# Altium footprint library MARCS Footprints.PcbLib: 53 footprints (part 2 of 4)
Each footprint in its own frame and in the unit in brackets; x right, y up, seen from the top. Pads: shape width x height; smd on the part's side, far side on the other; paste and mask are expansions set on the pad; w line width, h text height; cw(c..) or ccw(c..) is an arc to the next point about the centre after c.
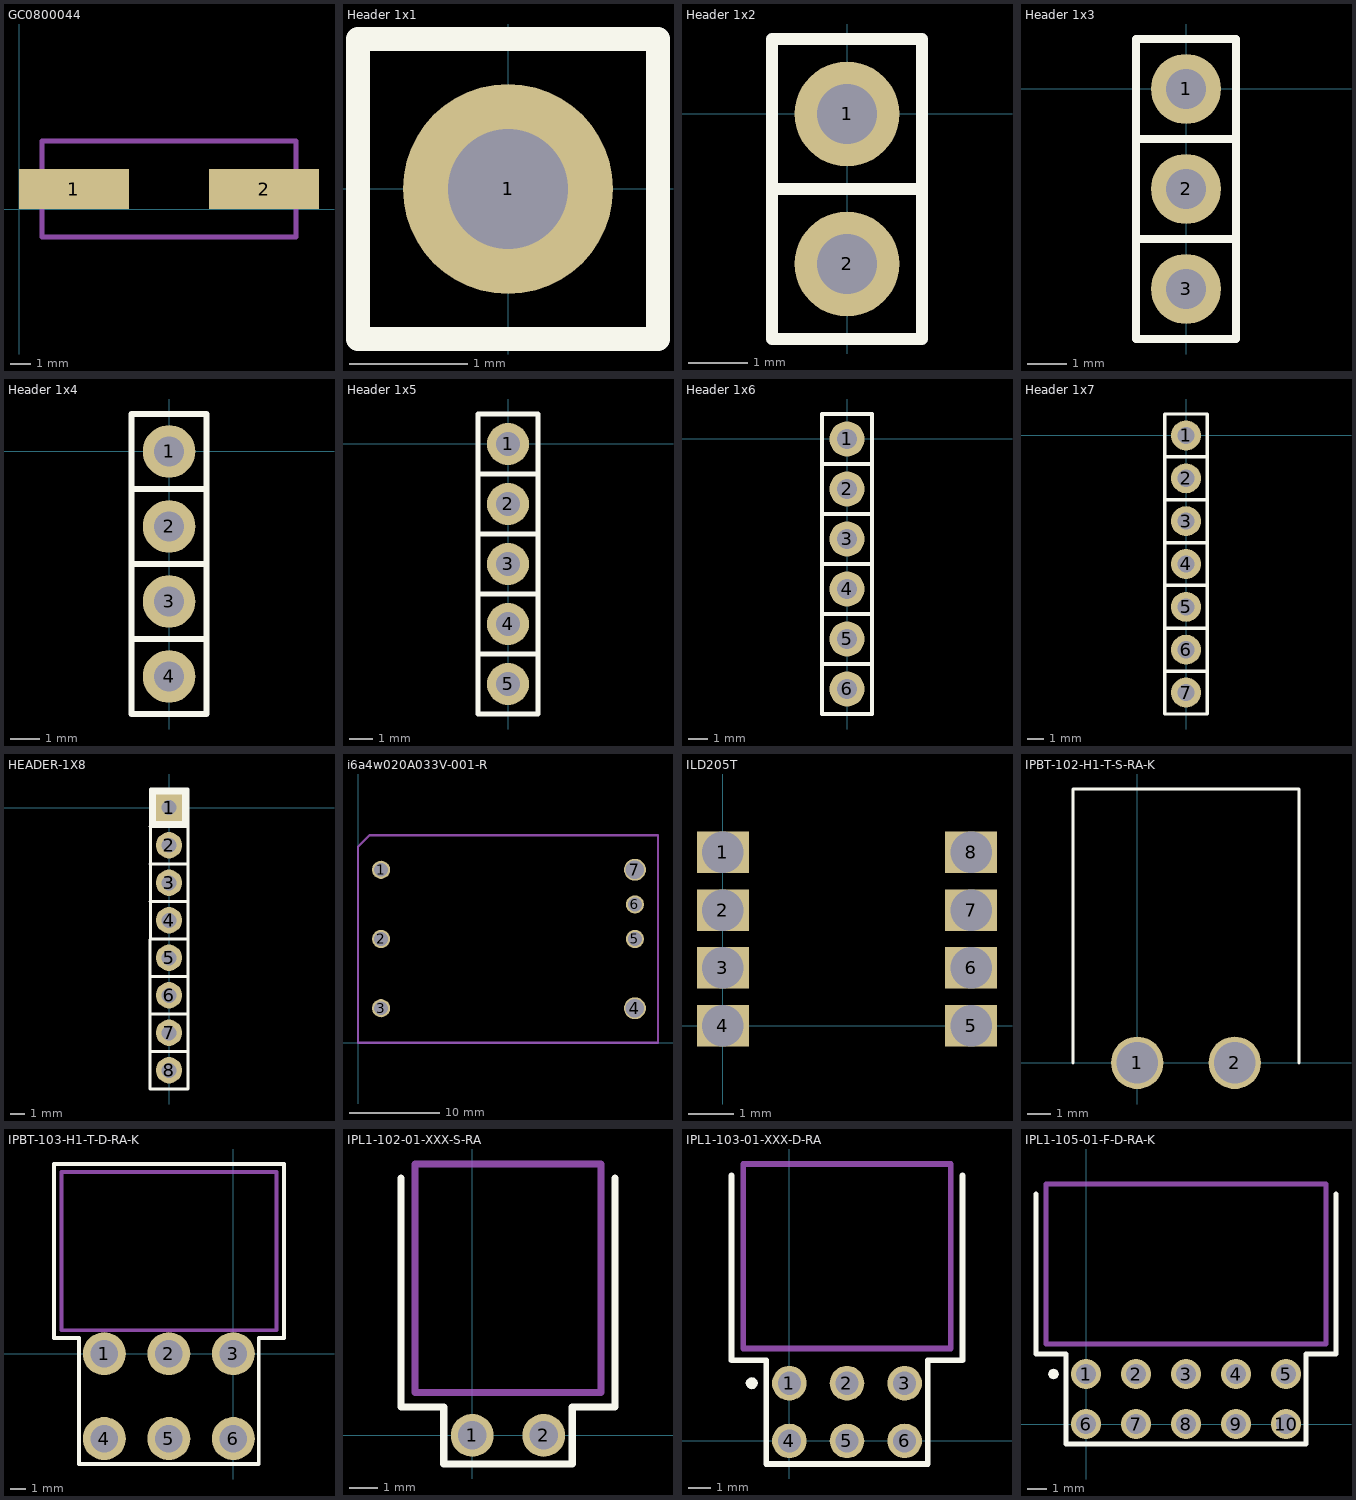
[diagram p1: the footprints below, top view; thin cyan lines are the x and y axes]

## GC0800044 [mm]
pads (2):
  rect 5.5x2 smd: 1(2.75,1) 2(12.25,1)
Mechanical 1:
  lines w0.254: 1.15,-1.4 1.15,3.4 13.85,3.4 13.85,-1.4 1.15,-1.4
3D body "User Library-hcm49.SLDPRT": height 4.24, standoff 0, extent 1.293,-1.424 13.693,3.406

## Header 1x1 [mil] ".1\" Header"
pads (1):
  round 70 hole 40: 1(0,0)
Top Overlay:
  lines w8: -50,-50 -50,50 50,50 50,-50 -50,-50
3D body: height 100, standoff 0, extent -50,-50 50,50

## Header 1x2 [mil] ".1\" Header"
pads (2):
  round 70 hole 40: 1(0,0) 2(0,-100)
Top Overlay:
  lines w8: -50,-50 50,-50 ; -50,-50 -50,50 50,50 50,-50 ; -50,-50 50,-50 ; -50,-50 -50,-150 50,-150 50,-50
3D body: height 100, standoff 0, extent -50,-50 50,50
3D body: height 100, standoff 0, extent -50,-150 50,-50

## Header 1x3 [mil] ".1\" Header"
pads (3):
  round 70 hole 40: 1(0,0) 2(0,-100) 3(0,-200)
Top Overlay:
  lines w8: -50,-250 50,-250 ; -50,-250 -50,-150 ; -50,-250 50,-250 ; -50,-150 50,-150 ; -50,-150 -50,-50 ; -50,-150 50,-150 ; -50,-50 50,-50 ; -50,-50 -50,50 50,50 50,-50 ; -50,-50 50,-50 ; 50,-250 50,-150 ; 50,-150 50,-50
3D body: height 100, standoff 0, extent -50,-250 50,-150
3D body: height 100, standoff 0, extent -50,-50 50,50
3D body: height 100, standoff 0, extent -50,-150 50,-50

## Header 1x4 [mil] ".1\" Header"
pads (4):
  round 70 hole 40: 1(0,0) 2(0,-100) 3(0,-200) 4(0,-300)
Top Overlay:
  lines w8: -50,-350 50,-350 ; -50,-350 -50,-250 ; -50,-350 50,-350 ; -50,-250 50,-250 ; -50,-250 -50,-150 ; -50,-250 50,-250 ; -50,-250 50,-250 ; -50,-150 50,-150 ; -50,-150 -50,-50 ; -50,-150 50,-150 ; -50,-50 50,-50 ; -50,-50 -50,50 50,50 50,-50 ; -50,-50 50,-50 ; 50,-350 50,-250 ; 50,-250 50,-150 ; 50,-150 50,-50
3D body: height 100, standoff 0, extent -50,-150 50,-50
3D body: height 100, standoff 0, extent -50,-50 50,50
3D body: height 100, standoff 0, extent -50,-250 50,-150
3D body: height 100, standoff 0, extent -50,-350 50,-250

## Header 1x5 [mil] ".1\" Header"
pads (5):
  round 70 hole 40: 1(0,0) 2(0,-100) 3(0,-200) 4(0,-300) 5(0,-400)
Top Overlay:
  lines w8: -50,-450 50,-450 ; -50,-450 -50,-350 ; -50,-450 50,-450 ; -50,-350 50,-350 ; -50,-350 -50,-250 ; -50,-350 50,-350 ; -50,-350 50,-350 ; -50,-250 50,-250 ; -50,-250 50,-250 ; -50,-250 -50,-150 ; -50,-250 50,-250 ; -50,-150 50,-150 ; -50,-150 -50,-50 ; -50,-150 50,-150 ; -50,-50 50,-50 ; -50,-50 -50,50 50,50 50,-50 ; -50,-50 50,-50 ; 50,-450 50,-350 ; 50,-350 50,-250 ; 50,-250 50,-150 ; 50,-150 50,-50
3D body: height 100, standoff 0, extent -50,-350 50,-250
3D body: height 100, standoff 0, extent -50,-250 50,-150
3D body: height 100, standoff 0, extent -50,-50 50,50
3D body: height 100, standoff 0, extent -50,-150 50,-50
3D body: height 100, standoff 0, extent -50,-450 50,-350

## Header 1x6 [mil] ".1\" Header"
pads (6):
  round 70 hole 40: 1(0,0) 2(0,-100) 3(0,-200) 4(0,-300) 5(0,-400) 6(0,-500)
Top Overlay:
  lines w8: -50,-550 50,-550 ; -50,-550 -50,-450 ; -50,-550 50,-550 ; -50,-450 50,-450 ; -50,-450 -50,-350 ; -50,-450 50,-450 ; -50,-450 50,-450 ; -50,-350 50,-350 ; -50,-350 50,-350 ; -50,-350 -50,-250 ; -50,-350 50,-350 ; -50,-250 50,-250 ; -50,-250 -50,-150 ; -50,-250 50,-250 ; -50,-250 50,-250 ; -50,-150 50,-150 ; -50,-150 -50,-50 ; -50,-150 50,-150 ; -50,-50 50,-50 ; -50,-50 -50,50 50,50 50,-50 ; -50,-50 50,-50 ; 50,-550 50,-450 ; 50,-450 50,-350 ; 50,-350 50,-250 ; 50,-250 50,-150 ; 50,-150 50,-50
3D body: height 100, standoff 0, extent -50,-450 50,-350
3D body: height 100, standoff 0, extent -50,-150 50,-50
3D body: height 100, standoff 0, extent -50,-50 50,50
3D body: height 100, standoff 0, extent -50,-250 50,-150
3D body: height 100, standoff 0, extent -50,-350 50,-250
3D body: height 100, standoff 0, extent -50,-550 50,-450

## Header 1x7 [mil] ".1\" Header"
pads (7):
  round 70 hole 40: 1(0,0) 2(0,-100) 3(0,-200) 4(0,-300) 5(0,-400) 6(0,-500) 7(0,-600)
Top Overlay:
  lines w8: -50,-650 50,-650 ; -50,-650 -50,-550 ; -50,-650 50,-650 ; -50,-550 50,-550 ; -50,-550 50,-550 ; -50,-550 -50,-450 ; -50,-550 50,-550 ; -50,-450 50,-450 ; -50,-450 -50,-350 ; -50,-450 50,-450 ; -50,-450 50,-450 ; -50,-350 50,-350 ; -50,-350 50,-350 ; -50,-350 -50,-250 ; -50,-350 50,-350 ; -50,-250 50,-250 ; -50,-250 -50,-150 ; -50,-250 50,-250 ; -50,-250 50,-250 ; -50,-150 50,-150 ; -50,-150 -50,-50 ; -50,-150 50,-150 ; -50,-50 50,-50 ; -50,-50 -50,50 50,50 50,-50 ; -50,-50 50,-50 ; 50,-650 50,-550 ; 50,-550 50,-450 ; 50,-450 50,-350 ; 50,-350 50,-250 ; 50,-250 50,-150 ; 50,-150 50,-50
3D body: height 100, standoff 0, extent -50,-650 50,-550
3D body: height 100, standoff 0, extent -50,-450 50,-350
3D body: height 100, standoff 0, extent -50,-150 50,-50
3D body: height 100, standoff 0, extent -50,-50 50,50
3D body: height 100, standoff 0, extent -50,-250 50,-150
3D body: height 100, standoff 0, extent -50,-350 50,-250
3D body: height 100, standoff 0, extent -50,-550 50,-450

## HEADER-1X8 [mil]
pads (8):
  rect 70x70 hole 40: 1(0,0)
  round 70 hole 40: 2(0,-100) 3(0,-200) 4(0,-300) 5(0,-400) 6(0,-500) 7(0,-600) 8(0,-700)
Top Overlay:
  rectangle: -50,-49.62 50,50
  lines w8: -50,-250 50,-250 ; -50,-150 50,-150 ; -50,-50 50,-50 ; -50,-750 50,-750 ; -50,-750 -50,50 50,50 50,-750 ; -50,-750 50,-750 ; -50,-750 50,-750 ; -50,-650 50,-650 -50,-650 ; -50,-550 50,-550 -50,-550 ; -50,-450 50,-450 -50,-450 ; -50,-350 50,-350 -50,-350
3D body: height 470, standoff -120, extent -15,-215 15,-185
3D body: height 100, standoff 0, extent -50,-750 50,50
3D body: height 470, standoff -120, extent -15,-115 15,-85
3D body: height 470, standoff -120, extent -15,-15 15,15
3D body: height 470, standoff -120, extent -15,-315 15,-285
3D body: height 470, standoff -120, extent -15,-415 15,-385
3D body: height 470, standoff -120, extent -15,-515 15,-485
3D body: height 470, standoff -120, extent -15,-615 15,-585
3D body: height 470, standoff -120, extent -15,-715 15,-685
3D body: height 101, standoff 100, extent -35,-35 35.5,35

## i6a4w020A033V-001-R [mil] "TDK Lambda DC/DC Converter"
pads (7):
  round 78.75 hole 60: 1(100,750) 2(100,450) 3(100,150) 5(1200,450) 6(1200,600)
  round 95 hole 80: 4(1200,150) 7(1200,750)
Mechanical 1:
  lines w10: 0,0 1300,0 1300,900 50,900 0,850 0,0
3D body "i6a4W DC-DC Converter Model.SLDPRT": height 474, standoff -140, extent 0,0 1300,900

## ILD205T [mm]
pads (8):
  rect 1.14x0.91 hole 0.91 square: 1(0,3.81) 2(0,2.54) 3(0,1.27) 4(0,0) 5(5.46,0) 6(5.46,1.27) 7(5.46,2.54) 8(5.46,3.81)

## IPBT-102-H1-T-S-RA-K [mm]
pads (2):
  round 2.25 hole 1.78: 1(0,0) 2(4.19,0)
Top Overlay:
  lines w0.127: -2.76,0 -2.76,11.77 6.95,11.77 6.95,0
3D body "IPBT-102-H1-T-S-RA-K.stp": height 7.71, standoff -3.29, extent -2.766,-0.607 6.95,11.775

## IPBT-103-H1-T-D-RA-K [mil]
pads (6):
  round 110 hole 70 mask+3: 1(-330,0) 2(-165,0) 3(0,0) 4(-330,-217) 5(-165,-217) 6(0,-217)
Top Overlay:
  lines w10: -459,40 -395,40 -395,-282 65,-282 65,40 130,40 130,485 -459,485 -459,40
Mechanical 1:
  lines w10: -439,60 110,60 110,465 -439,465 -439,60
  text "J1" at -17.57,247.5 h30

## IPL1-102-01-XXX-S-RA [mil]
pads (2):
  round 60 hole 40 mask+3: 1(0,0) 2(100,0)
Top Overlay:
  lines w10: -100,360 -100,40 -40,40 -40,-40 140,-40 140,40 200,40 200,360
Mechanical 1:
  lines w10: -80,60 180,60 180,380 -80,380 -80,60
3D body "IPL1-102-01-F-S-RA-K.stp": height 260, standoff -85, extent -80,-15 180,377.5

## IPL1-103-01-XXX-D-RA [mil]
pads (6):
  round 60 hole 40 mask+3: 1(0,100) 2(100,100) 3(200,100) 4(0,0) 5(100,0) 6(200,0)
Top Overlay:
  region: -54.8,100 -55.58,103.9 -57.79,107.21 -61.1,109.42 -65,110.2 -68.9,109.42 -72.21,107.21 -74.42,103.9 -75.2,100 -74.42,96.1 -72.21,92.79 -68.9,90.58 -65,89.8 -61.1,90.58 -57.79,92.79 -55.58,96.1
  lines w10: -100,460 -100,140 -40,140 -40,-40 240,-40 240,140 300,140 300,460
Mechanical 1:
  lines w10: -80,160 280,160 280,480 -80,480 -80,160
3D body "IPL1-103-01-F-D-RA-K.stp": height 315, standoff -80, extent -79.99,-12.49 280.01,480.01

## IPL1-105-01-F-D-RA-K [mil]
pads (10):
  round 60 hole 40 mask+3: 1(0,100) 2(100,100) 3(200,100) 4(300,100) 5(400,100) 6(0,0) 7(100,0) 8(200,0) 9(300,0) 10(400,0)
Top Overlay:
  region: -54.8,100 -55.58,103.9 -57.79,107.21 -61.1,109.42 -65,110.2 -68.9,109.42 -72.21,107.21 -74.42,103.9 -75.2,100 -74.42,96.1 -72.21,92.79 -68.9,90.58 -65,89.8 -61.1,90.58 -57.79,92.79 -55.58,96.1
  lines w10: -100,460 -100,140 -40,140 -40,-40 440,-40 440,140 500,140 500,460
Mechanical 1:
  lines w10: -80,160 480,160 480,480 -80,480 -80,160
3D body "IPL1-105-01-F-D-RA-K.stp": height 315, standoff -80, extent -79.99,-12.5 480.01,480